# Altium footprint library Chestin_PcbLib.PcbLib: 203 footprints (part 4 of 13)
Each footprint in its own frame and in the unit in brackets; x right, y up, seen from the top. Pads: shape width x height; smd on the part's side, far side on the other; paste and mask are expansions set on the pad; w line width, h text height; cw(c..) or ccw(c..) is an arc to the next point about the centre after c.
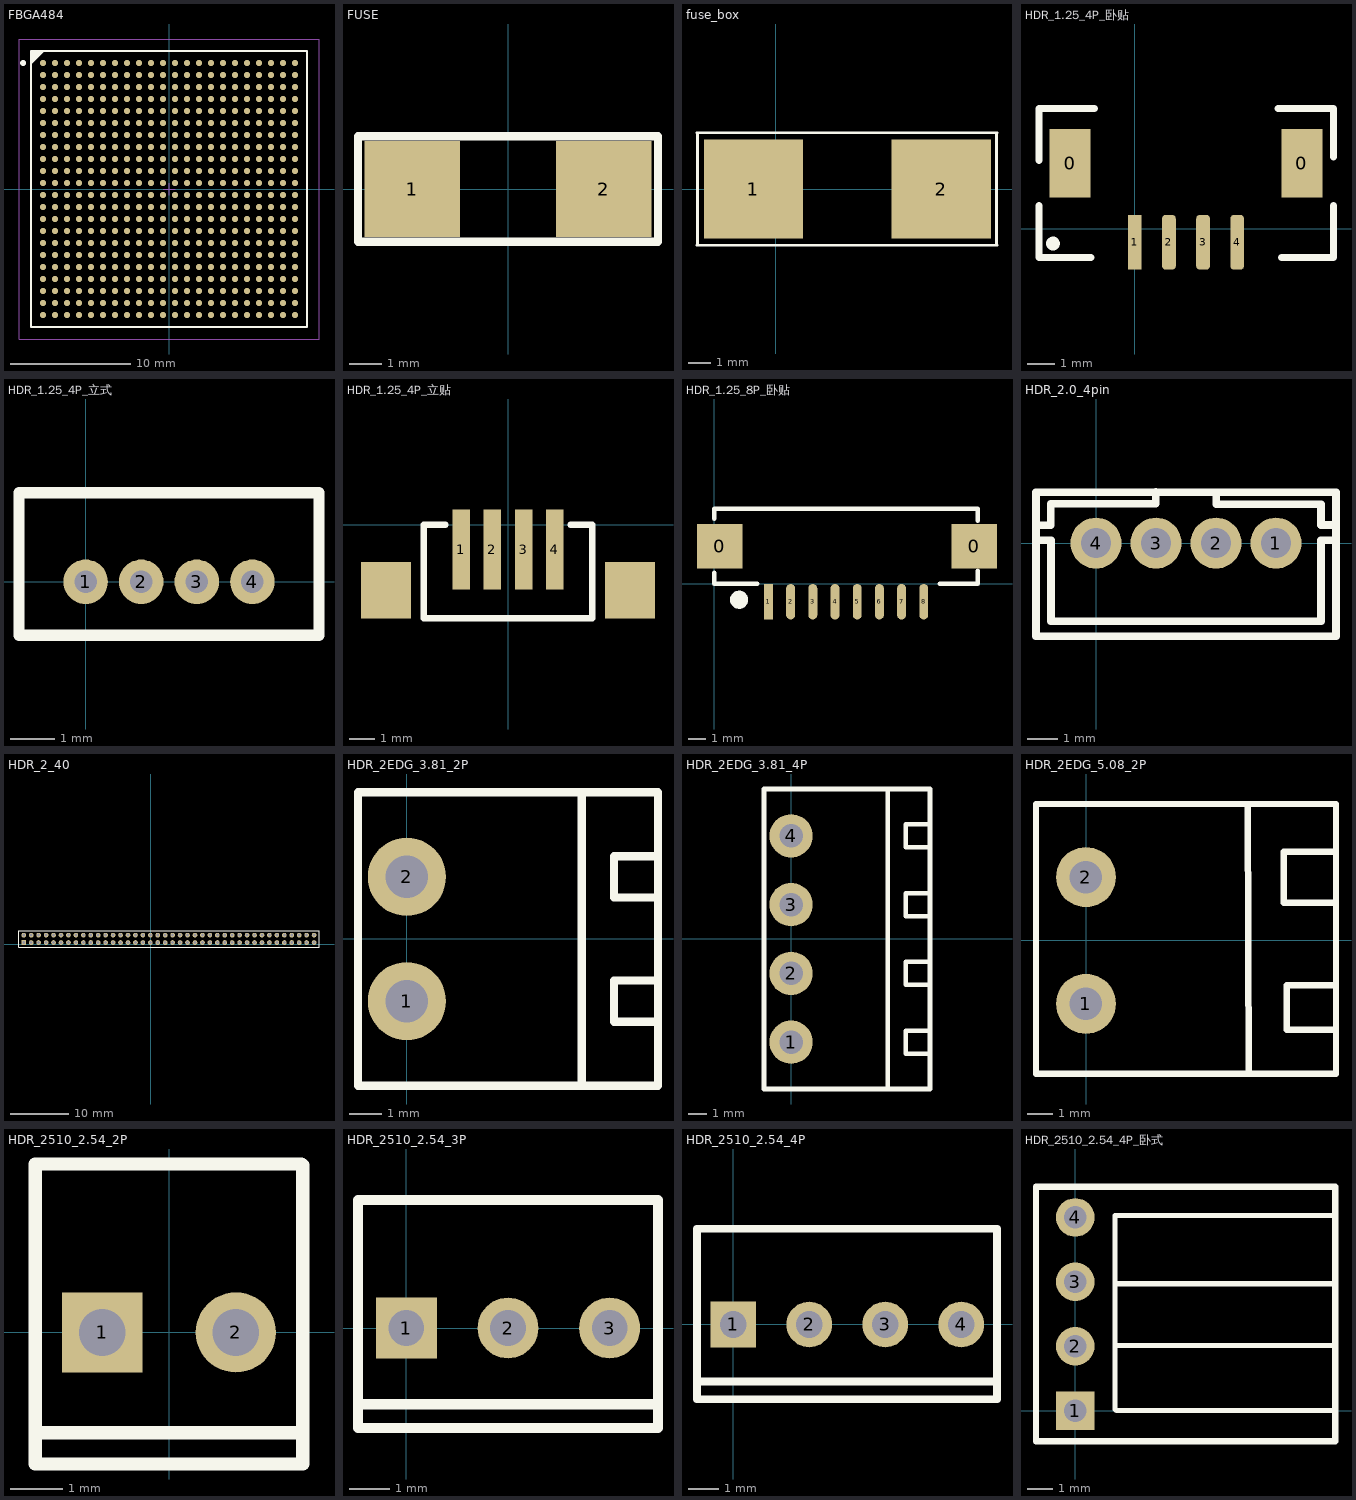
[diagram p3: the footprints below, top view; thin cyan lines are the x and y axes]

## FBGA484 [mm]
pads (484):
  round 0.5 smd: A1(-10.5,10.5) A2(-9.5,10.5) A3(-8.5,10.5) A4(-7.5,10.5) A5(-6.5,10.5) A6(-5.5,10.5) A7(-4.5,10.5) A8(-3.5,10.5) A9(-2.5,10.5) A10(-1.5,10.5) A11(-0.5,10.5) A12(0.5,10.5) A13(1.5,10.5) A14(2.5,10.5) A15(3.5,10.5) A16(4.5,10.5) A17(5.5,10.5) A18(6.5,10.5) A19(7.5,10.5) A20(8.5,10.5) A21(9.5,10.5) A22(10.5,10.5) AA1(-10.5,-9.5) AA2(-9.5,-9.5) AA3(-8.5,-9.5) AA4(-7.5,-9.5) AA5(-6.5,-9.5) AA6(-5.5,-9.5) AA7(-4.5,-9.5) AA8(-3.5,-9.5) AA9(-2.5,-9.5) AA10(-1.5,-9.5) AA11(-0.5,-9.5) AA12(0.5,-9.5) AA13(1.5,-9.5) AA14(2.5,-9.5) AA15(3.5,-9.5) AA16(4.5,-9.5) AA17(5.5,-9.5) AA18(6.5,-9.5) AA19(7.5,-9.5) AA20(8.5,-9.5) AA21(9.5,-9.5) AA22(10.5,-9.5) AB1(-10.5,-10.5) AB2(-9.5,-10.5) AB3(-8.5,-10.5) AB4(-7.5,-10.5) AB5(-6.5,-10.5) AB6(-5.5,-10.5) AB7(-4.5,-10.5) AB8(-3.5,-10.5) AB9(-2.5,-10.5) AB10(-1.5,-10.5) AB11(-0.5,-10.5) AB12(0.5,-10.5) AB13(1.5,-10.5) AB14(2.5,-10.5) AB15(3.5,-10.5) AB16(4.5,-10.5) AB17(5.5,-10.5) AB18(6.5,-10.5) AB19(7.5,-10.5) AB20(8.5,-10.5) AB21(9.5,-10.5) AB22(10.5,-10.5) B1(-10.5,9.5) B2(-9.5,9.5) B3(-8.5,9.5) B4(-7.5,9.5) B5(-6.5,9.5) B6(-5.5,9.5) B7(-4.5,9.5) B8(-3.5,9.5) B9(-2.5,9.5) B10(-1.5,9.5) B11(-0.5,9.5) B12(0.5,9.5) B13(1.5,9.5) B14(2.5,9.5) B15(3.5,9.5) B16(4.5,9.5) B17(5.5,9.5) B18(6.5,9.5) B19(7.5,9.5) B20(8.5,9.5) B21(9.5,9.5) B22(10.5,9.5) C1(-10.5,8.5) C2(-9.5,8.5) C3(-8.5,8.5) C4(-7.5,8.5) C5(-6.5,8.5) C6(-5.5,8.5) C7(-4.5,8.5) C8(-3.5,8.5) C9(-2.5,8.5) C10(-1.5,8.5) C11(-0.5,8.5) C12(0.5,8.5) C13(1.5,8.5) C14(2.5,8.5) C15(3.5,8.5) C16(4.5,8.5) C17(5.5,8.5) C18(6.5,8.5) C19(7.5,8.5) C20(8.5,8.5) C21(9.5,8.5) C22(10.5,8.5) D1(-10.5,7.5) D2(-9.5,7.5) D3(-8.5,7.5) D4(-7.5,7.5) D5(-6.5,7.5) D6(-5.5,7.5) D7(-4.5,7.5) D8(-3.5,7.5) D9(-2.5,7.5) D10(-1.5,7.5) D11(-0.5,7.5) D12(0.5,7.5) D13(1.5,7.5) D14(2.5,7.5) D15(3.5,7.5) D16(4.5,7.5) D17(5.5,7.5) D18(6.5,7.5) D19(7.5,7.5) D20(8.5,7.5) D21(9.5,7.5) D22(10.5,7.5) E1(-10.5,6.5) E2(-9.5,6.5) E3(-8.5,6.5) E4(-7.5,6.5) E5(-6.5,6.5) E6(-5.5,6.5) E7(-4.5,6.5) E8(-3.5,6.5) E9(-2.5,6.5) E10(-1.5,6.5) E11(-0.5,6.5) E12(0.5,6.5) E13(1.5,6.5) E14(2.5,6.5) E15(3.5,6.5) E16(4.5,6.5) E17(5.5,6.5) E18(6.5,6.5) E19(7.5,6.5) E20(8.5,6.5) E21(9.5,6.5) E22(10.5,6.5) F1(-10.5,5.5) F2(-9.5,5.5) F3(-8.5,5.5) F4(-7.5,5.5) F5(-6.5,5.5) F6(-5.5,5.5) F7(-4.5,5.5) F8(-3.5,5.5) F9(-2.5,5.5) F10(-1.5,5.5) F11(-0.5,5.5) F12(0.5,5.5) F13(1.5,5.5) F14(2.5,5.5) F15(3.5,5.5) F16(4.5,5.5) F17(5.5,5.5) F18(6.5,5.5) F19(7.5,5.5) F20(8.5,5.5) F21(9.5,5.5) F22(10.5,5.5) G1(-10.5,4.5) G2(-9.5,4.5) G3(-8.5,4.5) G4(-7.5,4.5) G5(-6.5,4.5) G6(-5.5,4.5) G7(-4.5,4.5) G8(-3.5,4.5) G9(-2.5,4.5) G10(-1.5,4.5) G11(-0.5,4.5) G12(0.5,4.5) G13(1.5,4.5) G14(2.5,4.5) G15(3.5,4.5) G16(4.5,4.5) G17(5.5,4.5) G18(6.5,4.5) G19(7.5,4.5) G20(8.5,4.5) G21(9.5,4.5) G22(10.5,4.5) H1(-10.5,3.5) H2(-9.5,3.5) H3(-8.5,3.5) H4(-7.5,3.5) H5(-6.5,3.5) H6(-5.5,3.5) H7(-4.5,3.5) H8(-3.5,3.5) H9(-2.5,3.5) H10(-1.5,3.5) H11(-0.5,3.5) H12(0.5,3.5) H13(1.5,3.5) H14(2.5,3.5) H15(3.5,3.5) H16(4.5,3.5) H17(5.5,3.5) H18(6.5,3.5) H19(7.5,3.5) H20(8.5,3.5) H21(9.5,3.5) H22(10.5,3.5) J1(-10.5,2.5) J2(-9.5,2.5) J3(-8.5,2.5) J4(-7.5,2.5) J5(-6.5,2.5) J6(-5.5,2.5) J7(-4.5,2.5) J8(-3.5,2.5) J9(-2.5,2.5) J10(-1.5,2.5) J11(-0.5,2.5) J12(0.5,2.5) J13(1.5,2.5) J14(2.5,2.5) J15(3.5,2.5) J16(4.5,2.5) J17(5.5,2.5) J18(6.5,2.5) J19(7.5,2.5) J20(8.5,2.5) J21(9.5,2.5) J22(10.5,2.5) K1(-10.5,1.5) K2(-9.5,1.5) K3(-8.5,1.5) K4(-7.5,1.5) K5(-6.5,1.5) K6(-5.5,1.5) K7(-4.5,1.5) K8(-3.5,1.5) K9(-2.5,1.5) K10(-1.5,1.5) K11(-0.5,1.5) K12(0.5,1.5) K13(1.5,1.5) K14(2.5,1.5) K15(3.5,1.5) K16(4.5,1.5) K17(5.5,1.5) K18(6.5,1.5) K19(7.5,1.5) K20(8.5,1.5) K21(9.5,1.5) K22(10.5,1.5) L1(-10.5,0.5) L2(-9.5,0.5) L3(-8.5,0.5) L4(-7.5,0.5) L5(-6.5,0.5) L6(-5.5,0.5) L7(-4.5,0.5) L8(-3.5,0.5) L9(-2.5,0.5) L10(-1.5,0.5) L11(-0.5,0.5) L12(0.5,0.5) L13(1.5,0.5) L14(2.5,0.5) L15(3.5,0.5) L16(4.5,0.5) L17(5.5,0.5) L18(6.5,0.5) L19(7.5,0.5) L20(8.5,0.5) L21(9.5,0.5) L22(10.5,0.5) M1(-10.5,-0.5) M2(-9.5,-0.5) M3(-8.5,-0.5) M4(-7.5,-0.5) M5(-6.5,-0.5) M6(-5.5,-0.5) M7(-4.5,-0.5) M8(-3.5,-0.5) M9(-2.5,-0.5) M10(-1.5,-0.5) M11(-0.5,-0.5) M12(0.5,-0.5) M13(1.5,-0.5) M14(2.5,-0.5) M15(3.5,-0.5) M16(4.5,-0.5) M17(5.5,-0.5) M18(6.5,-0.5) M19(7.5,-0.5) M20(8.5,-0.5) M21(9.5,-0.5) M22(10.5,-0.5) N1(-10.5,-1.5) N2(-9.5,-1.5) N3(-8.5,-1.5) N4(-7.5,-1.5) N5(-6.5,-1.5) N6(-5.5,-1.5) N7(-4.5,-1.5) N8(-3.5,-1.5) N9(-2.5,-1.5) N10(-1.5,-1.5) N11(-0.5,-1.5) N12(0.5,-1.5) N13(1.5,-1.5) N14(2.5,-1.5) N15(3.5,-1.5) N16(4.5,-1.5) N17(5.5,-1.5) N18(6.5,-1.5) N19(7.5,-1.5) N20(8.5,-1.5) N21(9.5,-1.5) N22(10.5,-1.5) P1(-10.5,-2.5) P2(-9.5,-2.5) P3(-8.5,-2.5) P4(-7.5,-2.5) P5(-6.5,-2.5) P6(-5.5,-2.5) P7(-4.5,-2.5) P8(-3.5,-2.5) P9(-2.5,-2.5) P10(-1.5,-2.5) P11(-0.5,-2.5) P12(0.5,-2.5) P13(1.5,-2.5) P14(2.5,-2.5) P15(3.5,-2.5) P16(4.5,-2.5) P17(5.5,-2.5) P18(6.5,-2.5) P19(7.5,-2.5) P20(8.5,-2.5) P21(9.5,-2.5) P22(10.5,-2.5) R1(-10.5,-3.5) R2(-9.5,-3.5) R3(-8.5,-3.5) R4(-7.5,-3.5) R5(-6.5,-3.5) R6(-5.5,-3.5) R7(-4.5,-3.5) R8(-3.5,-3.5) R9(-2.5,-3.5) R10(-1.5,-3.5) R11(-0.5,-3.5) R12(0.5,-3.5) R13(1.5,-3.5) R14(2.5,-3.5) R15(3.5,-3.5) R16(4.5,-3.5) R17(5.5,-3.5) R18(6.5,-3.5) R19(7.5,-3.5) R20(8.5,-3.5) R21(9.5,-3.5) R22(10.5,-3.5) T1(-10.5,-4.5) T2(-9.5,-4.5) T3(-8.5,-4.5) T4(-7.5,-4.5) T5(-6.5,-4.5) T6(-5.5,-4.5) T7(-4.5,-4.5) T8(-3.5,-4.5) T9(-2.5,-4.5) T10(-1.5,-4.5) T11(-0.5,-4.5) T12(0.5,-4.5) T13(1.5,-4.5) T14(2.5,-4.5) T15(3.5,-4.5) T16(4.5,-4.5) T17(5.5,-4.5) T18(6.5,-4.5) T19(7.5,-4.5) T20(8.5,-4.5) T21(9.5,-4.5) T22(10.5,-4.5) U1(-10.5,-5.5) U2(-9.5,-5.5) U3(-8.5,-5.5) U4(-7.5,-5.5) U5(-6.5,-5.5) U6(-5.5,-5.5) U7(-4.5,-5.5) U8(-3.5,-5.5) U9(-2.5,-5.5) U10(-1.5,-5.5) U11(-0.5,-5.5) U12(0.5,-5.5) U13(1.5,-5.5) U14(2.5,-5.5) U15(3.5,-5.5) U16(4.5,-5.5) U17(5.5,-5.5) U18(6.5,-5.5) U19(7.5,-5.5) U20(8.5,-5.5) U21(9.5,-5.5) U22(10.5,-5.5) V1(-10.5,-6.5) V2(-9.5,-6.5) V3(-8.5,-6.5) V4(-7.5,-6.5) V5(-6.5,-6.5) V6(-5.5,-6.5) V7(-4.5,-6.5) V8(-3.5,-6.5) V9(-2.5,-6.5) V10(-1.5,-6.5) V11(-0.5,-6.5) V12(0.5,-6.5) V13(1.5,-6.5) V14(2.5,-6.5) V15(3.5,-6.5) V16(4.5,-6.5) V17(5.5,-6.5) V18(6.5,-6.5) V19(7.5,-6.5) V20(8.5,-6.5) V21(9.5,-6.5) V22(10.5,-6.5) W1(-10.5,-7.5) W2(-9.5,-7.5) W3(-8.5,-7.5) W4(-7.5,-7.5) W5(-6.5,-7.5) W6(-5.5,-7.5) W7(-4.5,-7.5) W8(-3.5,-7.5) W9(-2.5,-7.5) W10(-1.5,-7.5) W11(-0.5,-7.5) W12(0.5,-7.5) W13(1.5,-7.5) W14(2.5,-7.5) W15(3.5,-7.5) W16(4.5,-7.5) W17(5.5,-7.5) W18(6.5,-7.5) W19(7.5,-7.5) W20(8.5,-7.5) W21(9.5,-7.5) W22(10.5,-7.5) Y1(-10.5,-8.5) Y2(-9.5,-8.5) Y3(-8.5,-8.5) Y4(-7.5,-8.5) Y5(-6.5,-8.5) Y6(-5.5,-8.5) Y7(-4.5,-8.5) Y8(-3.5,-8.5) Y9(-2.5,-8.5) Y10(-1.5,-8.5) Y11(-0.5,-8.5) Y12(0.5,-8.5) Y13(1.5,-8.5) Y14(2.5,-8.5) Y15(3.5,-8.5) Y16(4.5,-8.5) Y17(5.5,-8.5) Y18(6.5,-8.5) Y19(7.5,-8.5) Y20(8.5,-8.5) Y21(9.5,-8.5) Y22(10.5,-8.5)
Top Overlay:
  circle w0.25: c-12.15,10.5 r0.125
  region: -10.5,11.5 -11.5,10.5 -11.5,11.5
  lines w0.2: -11.5,10.5 -10.5,11.5 ; -11.5,-11.5 -11.5,11.5 11.5,11.5 11.5,-11.5 -11.5,-11.5
Mechanical 13:
  lines w0.1: -11.5,-11.5 -11.5,11.5 11.5,11.5 11.5,-11.5 -11.5,-11.5
Mechanical 15:
  lines w0.1: -0.5,0 0.5,0 ; 0,-0.5 0,0.5 ; -12.5,-12.5 -12.5,12.5 12.5,12.5 12.5,-12.5 -12.5,-12.5
3D body: height 3.5, standoff 0, extent -11.5,-11.5 11.5,11.5

## FUSE [mm] "1808"
pads (2):
  rect 3x3 smd: 1(-3,0) 2(3,0)
Top Overlay:
  lines w0.254: -4.699,-1.651 4.699,-1.651 4.699,1.651 -4.699,1.651 -4.699,-1.651

## fuse_box [mm]
pads (2):
  rect 4.5x4.5 smd: 1(-1,0) 2(7.5,0)
Top Overlay:
  lines w0.127: -3.556,-2.55 10.033,-2.55 ; -3.556,2.55 10.033,2.55 ; -3.54,-2.55 -3.54,2.55 ; 10.017,-2.55 10.017,2.55
3D body "保险丝.STEP": height 3.96, standoff 0.16, extent -1.825,-2.587 8.175,2.413

## HDR_1.25_4P_卧贴 [mm]
pads (6):
  rect 1.5x2.5 smd: 0(-2.375,2.4) 0(6.125,2.4)
  rect 0.5x2 smd: 1(0,-0.5)
  rrect50% 0.5x2 smd: 2(1.25,-0.5) 3(2.5,-0.5) 4(3.75,-0.5)
Top Overlay:
  circle w0.254: c-3.002,-0.547 r0.127
  lines w0.254: -3.51,0.85 -3.51,-1.055 -1.605,-1.055 ; -3.51,2.501 -3.51,4.406 -1.478,4.406 ; 5.253,4.406 7.285,4.406 7.285,2.628 ; 5.38,-1.055 7.285,-1.055 7.285,0.85

## HDR_1.25_4P_立式 [mm]
pads (4):
  round 1 hole 0.5: 1(0,0) 2(1.25,0) 3(2.5,0) 4(3.75,0)
Top Overlay:
  lines w0.254: -1.5,-1.2 -1.5,2 5.25,2 5.25,-1.2 -1.5,-1.2
3D body "1.STEP": height 4.7, standoff -2.3, extent -1.597,-1.143 5.153,2.057

## HDR_1.25_4P_立贴 [mm]
pads (6):
  rect 0.7x3.2 smd: 1(-1.875,-1) 2(-0.625,-1) 3(0.625,-1) 4(1.875,-1)
  rect 2x2.25 smd: ""(-4.875,-2.625) ""(4.875,-2.625)
Top Overlay:
  lines w0.254: -2.5,0 -3.375,0 -3.375,-3.75 3.375,-3.75 3.375,0 2.5,0
3D body "1.25-AB.STEP": height 4.8, standoff 0, extent -4.826,-3.755 4.924,-0.055

## HDR_1.25_8P_卧贴 [mm]
pads (10):
  rect 2.55x2.5 smd: 0(0.3,2.125) 0(14.651,2.125)
  rect 0.5x2 smd: 1(3.05,-1)
  oval 0.5x2 smd: 2(4.3,-1) 3(5.55,-1) 4(6.8,-1) 5(8.05,-1) 6(9.3,-1) 7(10.55,-1) 8(11.8,-1)
Top Overlay:
  circle w0.508: c1.397,-0.889 r0.254
  lines w0.254: 0,0.635 0,0 2.413,0 ; 0,3.683 0,4.25 14.85,4.25 14.85,3.565 ; 12.7,0 14.85,0 14.85,0.753

## HDR_2.0_4pin [mm]
pads (4):
  round 1.7 hole 1: 1(6,0) 2(4,0) 3(2,0) 4(0,0)
Top Overlay:
  lines w0.254: -2,0.1 -1.5,0.1 -1.5,-2.6 7.5,-2.6 7.5,0.098 8,0.098 ; -2,0.6 -1.502,0.6 -1.502,1.309 1.518,1.309 1.998,1.309 1.998,1.707 ; 4.009,1.7 4.009,1.3 7.5,1.3 7.5,1.1 7.5,0.606 8,0.606 ; -2,-3.1 -2,1.7 8,1.7 8,-3.1 -2,-3.1

## HDR_2_40 [mm]
pads (80):
  rect 0.8x0.8 hole 0.5: 1(-21.679,0.271)
  round 0.8 hole 0.5: 2(-20.409,0.271) 3(-19.139,0.271) 4(-17.869,0.271) 5(-16.599,0.271) 6(-15.329,0.271) 7(-14.059,0.271) 8(-12.789,0.271) 9(-11.519,0.271) 10(-10.249,0.271) 11(-8.979,0.271) 12(-7.709,0.271) 13(-6.439,0.271) 14(-5.169,0.271) 15(-3.899,0.271) 16(-2.629,0.271) 17(-1.359,0.271) 18(-0.089,0.271) 19(1.181,0.271) 20(2.451,0.271) 21(3.721,0.271) 22(4.991,0.271) 23(6.261,0.271) 24(7.531,0.271) 25(8.801,0.271) 26(10.071,0.271) 27(11.341,0.271) 28(12.611,0.271) 29(13.881,0.271) 30(15.151,0.271) 31(16.421,0.271) 32(17.691,0.271) 33(18.961,0.271) 34(20.231,0.271) 35(21.501,0.271) 36(22.771,0.271) 37(24.041,0.271) 38(25.311,0.271) 39(26.581,0.271) 40(27.851,0.271) 41(27.851,1.541) 42(26.581,1.541) 43(25.311,1.541) 44(24.041,1.541) 45(22.771,1.541) 46(21.501,1.541) 47(20.231,1.541) 48(18.961,1.541) 49(17.691,1.541) 50(16.421,1.541) 51(15.151,1.541) 52(13.881,1.541) 53(12.611,1.541) 54(11.341,1.541) 55(10.071,1.541) 56(8.801,1.541) 57(7.531,1.541) 58(6.261,1.541) 59(4.991,1.541) 60(3.721,1.541) 61(2.451,1.541) 62(1.181,1.541) 63(-0.089,1.541) 64(-1.359,1.541) 65(-2.629,1.541) 66(-3.899,1.541) 67(-5.169,1.541) 68(-6.439,1.541) 69(-7.709,1.541) 70(-8.979,1.541) 71(-10.249,1.541) 72(-11.519,1.541) 73(-12.789,1.541) 74(-14.059,1.541) 75(-15.329,1.541) 76(-16.599,1.541) 77(-17.869,1.541) 78(-19.139,1.541) 79(-20.409,1.541) 80(-21.679,1.541)
Top Overlay:
  lines w0.2: -22.491,-0.542 -22.491,2.303 28.69,2.303 28.69,-0.542 -22.491,-0.542

## HDR_2EDG_3.81_2P [mm]
pads (2):
  round 2.4 hole 1.3: 1(0,-1.905) 2(0,1.905)
Top Overlay:
  lines w0.254: 5.359,-4.5 5.359,4.5 ; 7.573,-2.54 6.35,-2.54 6.35,-1.27 7.7,-1.27 ; 7.7,1.27 6.35,1.27 6.35,2.54 7.7,2.54 ; -1.5,-4.5 -1.5,4.5 7.7,4.5 7.7,-4.5 -1.5,-4.5
3D body "CON_凤凰端子3.81_Header2.STEP": height 7.61, standoff -3.89, extent -1.019,-4.191 8.131,4.209

## HDR_2EDG_3.81_4P [mm]
pads (4):
  round 2.4 hole 1.3: 1(0,-5.715) 2(0,-1.905) 3(0,1.905) 4(0,5.715)
Top Overlay:
  lines w0.254: 5.359,-8.31 5.359,8.31 ; 7.573,-6.35 6.35,-6.35 6.35,-5.08 7.7,-5.08 ; 7.573,1.27 6.35,1.27 6.35,2.54 7.7,2.54 ; 7.7,-2.54 6.35,-2.54 6.35,-1.27 7.7,-1.27 ; 7.7,5.08 6.35,5.08 6.35,6.35 7.7,6.35 ; -1.5,-8.31 -1.5,8.31 7.7,8.31 7.7,-8.31 -1.5,-8.31
3D body "CON_凤凰端子3.81_Header4.STEP": height 7.6, standoff -3.9, extent -1.143,-8.01 8.007,8.01

## HDR_2EDG_5.08_2P [mm]
pads (2):
  round 2.4 hole 1.3: 1(0,-2.535) 2(0,2.535)
Top Overlay:
  lines w0.254: 6.477,5.461 6.509,-5.343 ; 10,-3.565 8.033,-3.565 8.033,-1.787 10,-1.787 ; 10,1.515 7.906,1.515 7.906,3.547 10,3.547 ; -2,-5.334 -2,5.461 10,5.461 10,-5.334 -2,-5.334
3D body "CON_凤凰端子_Header2.STEP": height 3.89, standoff -8.31, extent -2.011,-5.208 9.989,5.292

## HDR_2510_2.54_2P [mil]
height 153.54
pads (2):
  rect 60x60 hole 35: 1(-50,0)
  round 60 hole 35: 2(50,0)
Top Overlay:
  lines w10: -100,-75 100,-75 ; 99.02,125.98 -100,125.98 -100,-98.43 100,-98.43 100,125
3D body "接插件CON2.54_2J.": height 430.71, standoff -167.72, extent -100,-100 100,128.35

## HDR_2510_2.54_3P [mil]
height 153.54
pads (3):
  rect 60x60 hole 35: 1(0,0)
  round 60 hole 35: 2(100,0) 3(200,0)
Top Overlay:
  lines w10: -45,-75 245,-75 ; 247.64,125 247.64,-98.43 -47.64,-98.43 -47.64,125.98 247.64,125.98
3D body "接插件CON2.54_3J.STEP": height 430.71, standoff -167.72, extent -52,-100.35 248,128

## HDR_2510_2.54_4P [mil]
pads (4):
  rect 60x60 hole 35: 1(0,0)
  round 60 hole 35: 2(100,0) 3(200,0) 4(300,0)
Top Overlay:
  lines w10: -47.64,-75 347,-75 ; -47.64,-98.43 347,-98.43 347,125.98 -47.64,125.98 -47.64,-98.43
3D body "SW3dPS-CON-148.STEP": height 472.46, standoff -137.8, extent -34,-130.38 340.01,105.84

## HDR_2510_2.54_4P_卧式 [mil]
height 47.24
pads (4):
  rect 60x60 hole 35: 1(0,0)
  round 60 hole 35: 2(0,100) 3(0,200) 4(0,300)
Top Overlay:
  lines w7.87: 63,101 405,101 ; 63,197 404,197 ; 404,0 64,0 62,2 62,303 404,303
  lines w10: -61,-47.64 404,-47.64 404,347.64 -61,347.64 -61,-47.64